# Altium footprint library ICs_rus.PCBLIB: 103 footprints (part 6 of 7)
Each footprint in its own frame and in the unit in brackets; x right, y up, seen from the top. Pads: shape width x height; smd on the part's side, far side on the other; paste and mask are expansions set on the pad; w line width, h text height; cw(c..) or ccw(c..) is an arc to the next point about the centre after c.
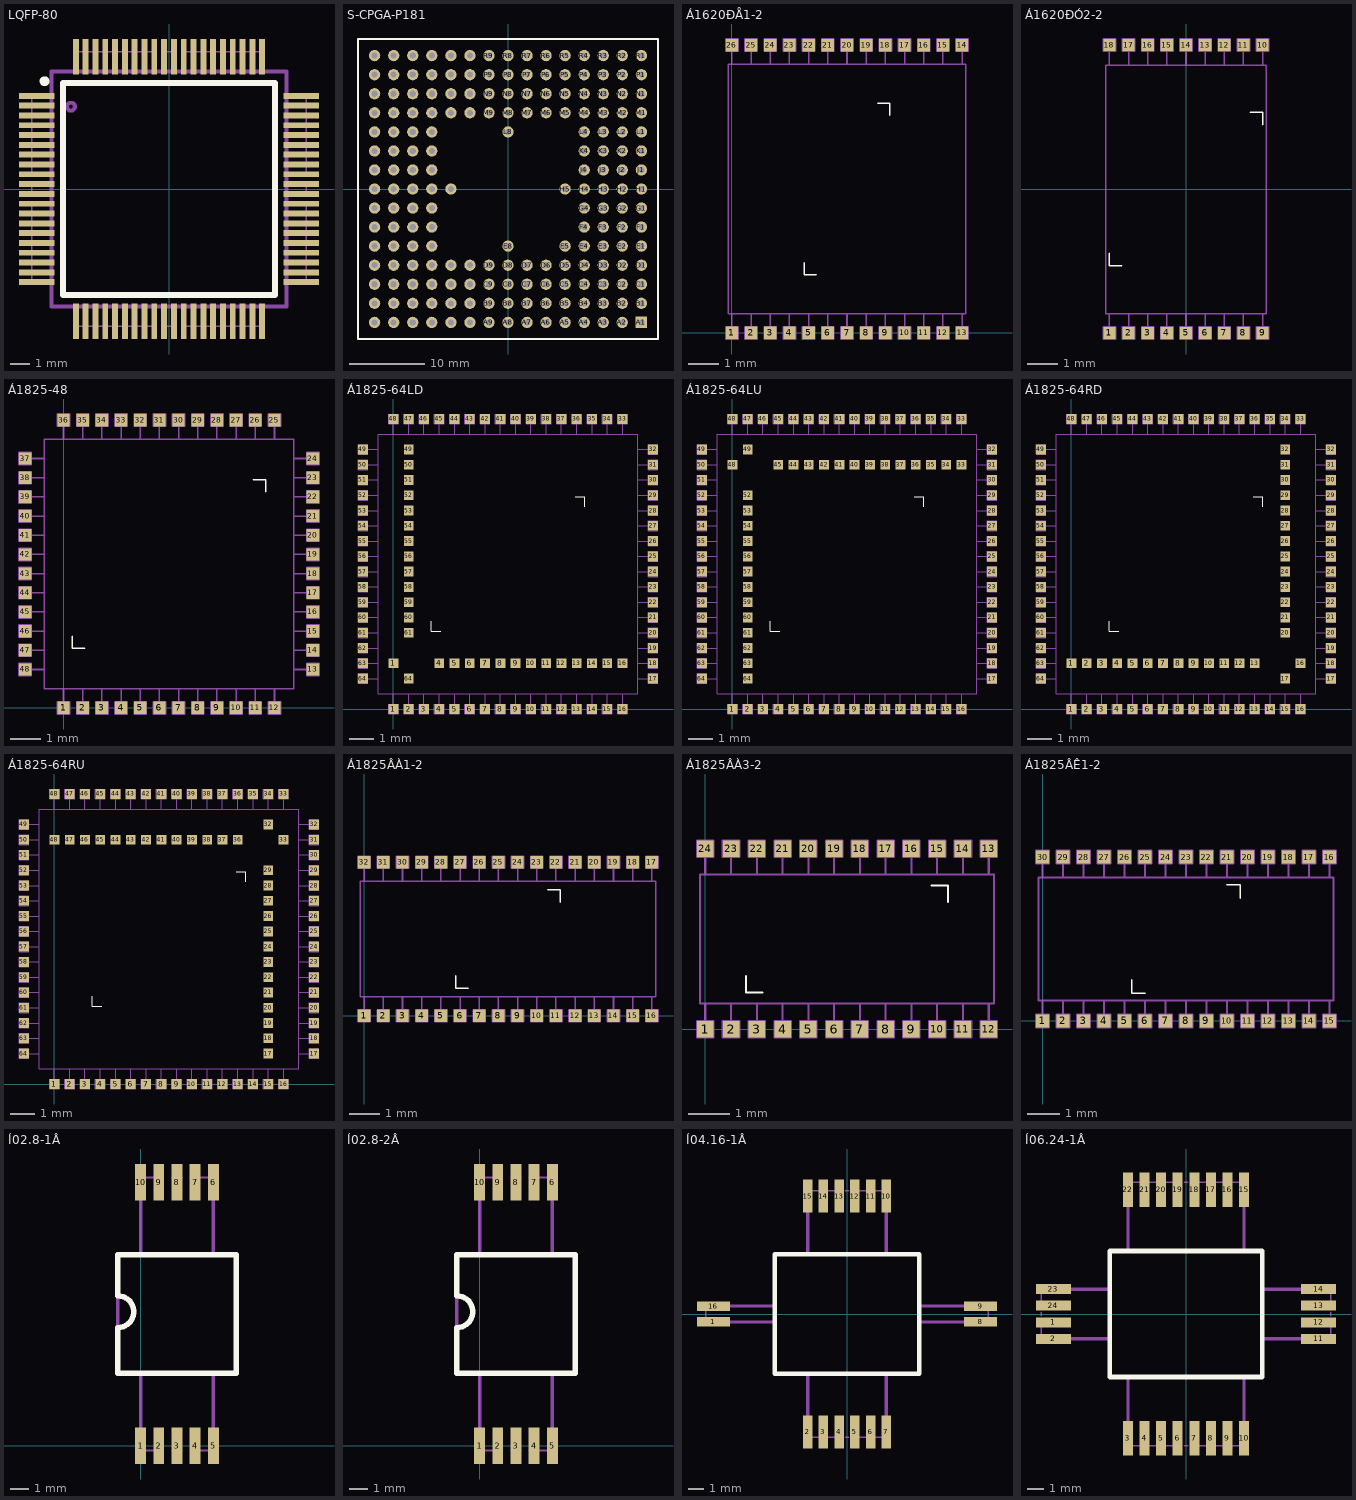
[diagram p5: the footprints below, top view; thin cyan lines are the x and y axes]

## LQFP-80 [mm]
height 1.45
pads (80):
  rect 1.8x0.3 smd: 1(-6.75,4.75) 2(-6.75,4.25) 3(-6.75,3.75) 4(-6.75,3.25) 5(-6.75,2.75) 6(-6.75,2.25) 7(-6.75,1.75) 8(-6.75,1.25) 9(-6.75,0.75) 10(-6.75,0.25) 11(-6.75,-0.25) 12(-6.75,-0.75) 13(-6.75,-1.25) 14(-6.75,-1.75) 15(-6.75,-2.25) 16(-6.75,-2.75) 17(-6.75,-3.25) 18(-6.75,-3.75) 19(-6.75,-4.25) 20(-6.75,-4.75) 41(6.75,-4.75) 42(6.75,-4.25) 43(6.75,-3.75) 44(6.75,-3.25) 45(6.75,-2.75) 46(6.75,-2.25) 47(6.75,-1.75) 48(6.75,-1.25) 49(6.75,-0.75) 50(6.75,-0.25) 51(6.75,0.25) 52(6.75,0.75) 53(6.75,1.25) 54(6.75,1.75) 55(6.75,2.25) 56(6.75,2.75) 57(6.75,3.25) 58(6.75,3.75) 59(6.75,4.25) 60(6.75,4.75)
  rect 0.3x1.8 smd: 21(-4.75,-6.75) 22(-4.25,-6.75) 23(-3.75,-6.75) 24(-3.25,-6.75) 25(-2.75,-6.75) 26(-2.25,-6.75) 27(-1.75,-6.75) 28(-1.25,-6.75) 29(-0.75,-6.75) 30(-0.25,-6.75) 31(0.25,-6.75) 32(0.75,-6.75) 33(1.25,-6.75) 34(1.75,-6.75) 35(2.25,-6.75) 36(2.75,-6.75) 37(3.25,-6.75) 38(3.75,-6.75) 39(4.25,-6.75) 40(4.75,-6.75) 61(4.75,6.75) 62(4.25,6.75) 63(3.75,6.75) 64(3.25,6.75) 65(2.75,6.75) 66(2.25,6.75) 67(1.75,6.75) 68(1.25,6.75) 69(0.75,6.75) 70(0.25,6.75) 71(-0.25,6.75) 72(-0.75,6.75) 73(-1.25,6.75) 74(-1.75,6.75) 75(-2.25,6.75) 76(-2.75,6.75) 77(-3.25,6.75) 78(-3.75,6.75) 79(-4.25,6.75) 80(-4.75,6.75)
Top Overlay:
  circle w0.3: c-6.35,5.5 r0.1
  lines w0.3: -5.4,-5.4 -5.4,5.4 5.4,5.4 5.4,-5.4 -5.4,-5.4
Mechanical 1:
  lines w0.1: -7,-4.75 -7,-4.25 -7,-0.75 ; -7,-0.25 -7,0.25 ; -7,0.75 -7,4.75 ; -4.75,-7 -0.75,-7 ; -4.75,7 -4.25,7 -0.75,7 ; -0.25,-7 0.25,-7 ; -0.25,7 0.25,7 ; 0.75,-7 4.25,-7 4.75,-7 ; 0.75,7 4.75,7 ; 7,-4.75 7,-0.75 ; 7,-0.25 7,0.25 ; 7,0.75 7,4.25 7,4.75
  lines w0.2: -7,-4.75 -6,-4.75 ; -7,4.75 -6,4.75 ; -4.75,-7 -4.75,-6 ; -4.75,6 -4.75,7 ; 4.75,-7 4.75,-6 ; 4.75,6 4.75,7 ; 6,-4.75 7,-4.75 ; 6,4.75 7,4.75 ; -6,-6 -6,6 6,6 6,-6 -6,-6 ; -4.8,4.2 ccw(c-5,4.2) -4.8,4.2
  text "80" at -4.6,4.4 h1.5
  text ".Comment" at -2.87,-1.47 h1.5
  text ".Designator" at -1.28,0.23 h1.5
3D body: height 1.47, standoff 0, extent -7,-7 7,7

## S-CPGA-P181 [mm]
pads (181):
  rect 1.5x1.5 hole 0.8: A1(17.78,-17.78)
  round 1.5 hole 0.8: A2(15.24,-17.78) A3(12.7,-17.78) A4(10.16,-17.78) A5(7.62,-17.78) A6(5.08,-17.78) A7(2.54,-17.78) A8(0,-17.78) A9(-2.54,-17.78) A10(-5.08,-17.78) A11(-7.62,-17.78) A12(-10.16,-17.78) A13(-12.7,-17.78) A14(-15.24,-17.78) A15(-17.78,-17.78) B1(17.78,-15.24) B2(15.24,-15.24) B3(12.7,-15.24) B4(10.16,-15.24) B5(7.62,-15.24) B6(5.08,-15.24) B7(2.54,-15.24) B8(0,-15.24) B9(-2.54,-15.24) B10(-5.08,-15.24) B11(-7.62,-15.24) B12(-10.16,-15.24) B13(-12.7,-15.24) B14(-15.24,-15.24) B15(-17.78,-15.24) C1(17.78,-12.7) C2(15.24,-12.7) C3(12.7,-12.7) C4(10.16,-12.7) C5(7.62,-12.7) C6(5.08,-12.7) C7(2.54,-12.7) C8(0,-12.7) C9(-2.54,-12.7) C10(-5.08,-12.7) C11(-7.62,-12.7) C12(-10.16,-12.7) C13(-12.7,-12.7) C14(-15.24,-12.7) C15(-17.78,-12.7) D1(17.78,-10.16) D2(15.24,-10.16) D3(12.7,-10.16) D4(10.16,-10.16) D5(7.62,-10.16) D6(5.08,-10.16) D7(2.54,-10.16) D8(0,-10.16) D9(-2.54,-10.16) D10(-5.08,-10.16) D11(-7.62,-10.16) D12(-10.16,-10.16) D13(-12.7,-10.16) D14(-15.24,-10.16) D15(-17.78,-10.16) E1(17.78,-7.62) E2(15.24,-7.62) E3(12.7,-7.62) E4(10.16,-7.62) E5(7.62,-7.62) E8(0,-7.62) E12(-10.16,-7.62) E13(-12.7,-7.62) E14(-15.24,-7.62) E15(-17.78,-7.62) F1(17.78,-5.08) F2(15.24,-5.08) F3(12.7,-5.08) F4(10.16,-5.08) F12(-10.16,-5.08) F13(-12.7,-5.08) F14(-15.24,-5.08) F15(-17.78,-5.08) G1(17.78,-2.54) G2(15.24,-2.54) G3(12.7,-2.54) G4(10.16,-2.54) G12(-10.16,-2.54) G13(-12.7,-2.54) G14(-15.24,-2.54) G15(-17.78,-2.54) H1(17.78,0) H2(15.24,0) H3(12.7,0) H4(10.16,0) H5(7.62,0) H11(-7.62,0) H12(-10.16,0) H13(-12.7,0) H14(-15.24,0) H15(-17.78,0) J1(17.78,2.54) J2(15.24,2.54) J3(12.7,2.54) J4(10.16,2.54) J12(-10.16,2.54) J13(-12.7,2.54) J14(-15.24,2.54) J15(-17.78,2.54) K1(17.78,5.08) K2(15.24,5.08) K3(12.7,5.08) K4(10.16,5.08) K12(-10.16,5.08) K13(-12.7,5.08) K14(-15.24,5.08) K15(-17.78,5.08) L1(17.78,7.62) L2(15.24,7.62) L3(12.7,7.62) L4(10.16,7.62) L8(0,7.62) L12(-10.16,7.62) L13(-12.7,7.62) L14(-15.24,7.62) L15(-17.78,7.62) M1(17.78,10.16) M2(15.24,10.16) M3(12.7,10.16) M4(10.16,10.16) M5(7.62,10.16) M6(5.08,10.16) M7(2.54,10.16) M8(0,10.16) M9(-2.54,10.16) M10(-5.08,10.16) M11(-7.62,10.16) M12(-10.16,10.16) M13(-12.7,10.16) M14(-15.24,10.16) M15(-17.78,10.16) N1(17.78,12.7) N2(15.24,12.7) N3(12.7,12.7) N4(10.16,12.7) N5(7.62,12.7) N6(5.08,12.7) N7(2.54,12.7) N8(0,12.7) N9(-2.54,12.7) N10(-5.08,12.7) N11(-7.62,12.7) N12(-10.16,12.7) N13(-12.7,12.7) N14(-15.24,12.7) N15(-17.78,12.7) P1(17.78,15.24) P2(15.24,15.24) P3(12.7,15.24) P4(10.16,15.24) P5(7.62,15.24) P6(5.08,15.24) P7(2.54,15.24) P8(0,15.24) P9(-2.54,15.24) P10(-5.08,15.24) P11(-7.62,15.24) P12(-10.16,15.24) P13(-12.7,15.24) P14(-15.24,15.24) P15(-17.78,15.24) R1(17.78,17.78) R2(15.24,17.78) R3(12.7,17.78) R4(10.16,17.78) R5(7.62,17.78) R6(5.08,17.78) R7(2.54,17.78) R8(0,17.78) R9(-2.54,17.78) R10(-5.08,17.78) R11(-7.62,17.78) R12(-10.16,17.78) R13(-12.7,17.78) R14(-15.24,17.78) R15(-17.78,17.78)
Top Overlay:
  lines w0.3: -20,-20 -20,20 20,20 20,-20 -20,-20
Mechanical 1:
  lines w0.2: -20,-20 -20,20 20,20 20,-20 -20,-20
  text ".Comment" at -3.9,-0.7 h1.5
  text ".Designator" at -2,1.4 h1.5
3D body: height 4.6, standoff -3, extent -20,-20 20,20

## Á1620ÐÅ1-2 [mm]
pads (26):
  rect 0.4x0.4 smd mask+0: 1(0,0) 2(0.625,0) 3(1.25,0) 4(1.875,0) 5(2.5,0) 6(3.125,0) 7(3.75,0) 8(4.375,0) 9(5,0) 10(5.625,0) 11(6.25,0) 12(6.875,0) 13(7.5,0) 14(7.5,9.375) 15(6.875,9.375) 16(6.25,9.375) 17(5.625,9.375) 18(5,9.375) 19(4.375,9.375) 20(3.75,9.375) 21(3.125,9.375) 22(2.5,9.375) 23(1.875,9.375) 24(1.25,9.375) 25(0.625,9.375) 26(0,9.375)
Top Overlay:
  lines w0.05: 2.35,2.287 2.35,1.887 2.75,1.887 ; 4.75,7.487 5.15,7.487 5.15,7.087
Mechanical 1:
  lines w0.05: 0,0.2 0,0.625 ; 0,8.75 0,9.18 ; 0.625,0.2 0.625,0.625 ; 0.625,8.75 0.625,9.17 ; 1.25,0.2 1.25,0.625 ; 1.25,8.75 1.25,9.17 ; 1.875,0.21 1.875,0.625 ; 1.875,8.75 1.875,9.17 ; 2.5,0.2 2.5,0.625 ; 2.5,8.75 2.5,9.17 ; 3.125,0.2 3.125,0.625 ; 3.125,8.75 3.125,9.17 ; 3.75,0.2 3.75,0.625 ; 3.75,8.75 3.75,9.17 ; 4.375,0.2 4.375,0.625 ; 4.375,8.75 4.375,9.17 ; 5,0.2 5,0.625 ; 5,8.75 5,9.17 ; 5.625,0.2 5.625,0.625 ; 5.625,8.75 5.625,9.17 ; 6.25,0.21 6.25,0.625 ; 6.25,8.75 6.25,9.17 ; 6.875,0.2 6.875,0.625 ; 6.875,8.75 6.875,9.17 ; 7.5,0.2 7.5,0.625 ; 7.5,8.75 7.5,9.17 ; -0.2,-0.2 -0.2,0.2 0.2,0.2 0.2,-0.2 -0.2,-0.2 ; -0.2,9.175 0.2,9.175 0.2,9.575 -0.2,9.575 -0.2,9.175 ; -0.125,0.625 -0.125,8.75 7.625,8.75 7.625,0.625 -0.125,0.625 ; 0.425,-0.2 0.425,0.2 0.825,0.2 0.825,-0.2 0.425,-0.2 ; 0.425,9.175 0.425,9.575 0.825,9.575 0.825,9.175 0.425,9.175 ; 1.05,-0.2 1.05,0.2 1.45,0.2 1.45,-0.2 1.05,-0.2 ; 1.05,9.175 1.05,9.575 1.45,9.575 1.45,9.175 1.05,9.175 ; 1.675,-0.2 1.675,0.2 2.075,0.2 2.075,-0.2 1.675,-0.2 ; 1.675,9.175 1.675,9.575 2.075,9.575 2.075,9.175 1.675,9.175 ; 2.3,-0.2 2.3,0.2 2.7,0.2 2.7,-0.2 2.3,-0.2 ; 2.3,9.175 2.3,9.575 2.7,9.575 2.7,9.175 2.3,9.175 ; 2.925,-0.2 2.925,0.2 3.325,0.2 3.325,-0.2 2.925,-0.2 ; 2.925,9.175 2.925,9.575 3.325,9.575 3.325,9.175 2.925,9.175 ; 3.55,-0.2 3.55,0.2 3.95,0.2 3.95,-0.2 3.55,-0.2 ; 3.55,9.175 3.55,9.575 3.95,9.575 3.95,9.175 3.55,9.175 ; 4.175,-0.2 4.175,0.2 4.575,0.2 4.575,-0.2 4.175,-0.2 ; 4.175,9.175 4.175,9.575 4.575,9.575 4.575,9.175 4.175,9.175 ; 4.8,-0.2 4.8,0.2 5.2,0.2 5.2,-0.2 4.8,-0.2 ; 4.8,9.175 4.8,9.575 5.2,9.575 5.2,9.175 4.8,9.175 ; 5.425,-0.2 5.425,0.2 5.825,0.2 5.825,-0.2 5.425,-0.2 ; 5.425,9.175 5.425,9.575 5.825,9.575 5.825,9.175 5.425,9.175 ; 6.05,-0.2 6.05,0.2 6.45,0.2 6.45,-0.2 6.05,-0.2 ; 6.05,9.175 6.05,9.575 6.45,9.575 6.45,9.175 6.05,9.175 ; 6.675,-0.2 6.675,0.2 7.075,0.2 7.075,-0.2 6.675,-0.2 ; 6.675,9.175 6.675,9.575 7.075,9.575 7.075,9.175 6.675,9.175 ; 7.3,-0.2 7.3,0.2 7.7,0.2 7.7,-0.2 7.3,-0.2 ; 7.3,9.175 7.3,9.575 7.7,9.575 7.7,9.175 7.3,9.175
  text "9" at 4.95,-0.1 h0.35
  text "8" at 4.325,-0.1 h0.35
  text "7" at 3.7,-0.1 h0.35
  text "6" at 3.075,-0.1 h0.35
  text "5" at 2.45,-0.1 h0.35
  text "4" at 1.825,-0.1 h0.35
  text "3" at 1.2,-0.1 h0.35
  text "2" at 0.575,-0.1 h0.35
  text "1" at -0.05,-0.1 h0.35
  text "10" at 5.475,-0.1 h0.35
  text "11" at 6.1,-0.1 h0.35
  text "12" at 6.725,-0.1 h0.35
  text "13" at 7.35,-0.1 h0.35
  text ".Comment" at 2.8,3.9 h0.4
  text ".Designator" at 3.15,4.7 h0.6
  text "24" at 1.1,9.275 h0.35
  text "23" at 1.725,9.275 h0.35
  text "22" at 2.35,9.275 h0.35
  text "21" at 2.975,9.275 h0.35
  text "20" at 3.6,9.275 h0.35
  text "19" at 4.225,9.275 h0.35
  text "18" at 4.85,9.275 h0.35
  text "17" at 5.475,9.275 h0.35
  text "16" at 6.125,9.275 h0.35
  text "15" at 6.75,9.275 h0.35
  text "14" at 7.375,9.275 h0.35
  text "25" at 0.475,9.275 h0.35
  text "26" at -0.15,9.275 h0.35

## Á1620ÐÓ2-2 [mm]
pads (18):
  rect 0.4x0.4 smd mask+0: 1(-2.5,-4.7) 2(-1.875,-4.7) 3(-1.25,-4.7) 4(-0.625,-4.7) 5(0,-4.7) 6(0.625,-4.7) 7(1.25,-4.7) 8(1.875,-4.7) 9(2.5,-4.7) 10(2.5,4.7) 11(1.875,4.7) 12(1.25,4.7) 13(0.625,4.7) 14(0,4.7) 15(-0.625,4.7) 16(-1.25,4.7) 17(-1.875,4.7) 18(-2.5,4.7)
Top Overlay:
  lines w0.05: -2.5,-2.1 -2.5,-2.5 -2.1,-2.5 ; 2.1,2.5 2.5,2.5 2.5,2.1
Mechanical 1:
  lines w0.05: -2.5,-4.5 -2.5,-4.075 ; -2.5,4.05 -2.5,4.48 ; -1.875,-4.5 -1.875,-4.075 ; -1.875,4.05 -1.875,4.47 ; -1.25,-4.5 -1.25,-4.075 ; -1.25,4.05 -1.25,4.47 ; -0.625,-4.49 -0.625,-4.075 ; -0.625,4.05 -0.625,4.47 ; 0,-4.5 0,-4.075 ; 0,4.05 0,4.47 ; 0.625,-4.5 0.625,-4.075 ; 0.625,4.05 0.625,4.47 ; 1.25,-4.5 1.25,-4.075 ; 1.25,4.05 1.25,4.47 ; 1.875,-4.5 1.875,-4.075 ; 1.875,4.05 1.875,4.47 ; 2.5,-4.5 2.5,-4.075 ; 2.5,4.05 2.5,4.47 ; -2.7,-4.9 -2.7,-4.5 -2.3,-4.5 -2.3,-4.9 -2.7,-4.9 ; -2.7,4.5 -2.7,4.9 -2.3,4.9 -2.3,4.5 -2.7,4.5 ; -2.625,-4.075 -2.625,4.05 2.625,4.05 2.625,-4.075 -2.625,-4.075 ; -2.075,-4.9 -2.075,-4.5 -1.675,-4.5 -1.675,-4.9 -2.075,-4.9 ; -2.075,4.5 -2.075,4.9 -1.675,4.9 -1.675,4.5 -2.075,4.5 ; -1.45,-4.9 -1.45,-4.5 -1.05,-4.5 -1.05,-4.9 -1.45,-4.9 ; -1.45,4.5 -1.45,4.9 -1.05,4.9 -1.05,4.5 -1.45,4.5 ; -0.825,-4.9 -0.825,-4.5 -0.425,-4.5 -0.425,-4.9 -0.825,-4.9 ; -0.825,4.5 -0.825,4.9 -0.425,4.9 -0.425,4.5 -0.825,4.5 ; -0.2,-4.9 -0.2,-4.5 0.2,-4.5 0.2,-4.9 -0.2,-4.9 ; -0.2,4.5 -0.2,4.9 0.2,4.9 0.2,4.5 -0.2,4.5 ; 0.425,-4.9 0.425,-4.5 0.825,-4.5 0.825,-4.9 0.425,-4.9 ; 0.425,4.5 0.825,4.5 0.825,4.9 0.425,4.9 0.425,4.5 ; 1.05,-4.9 1.05,-4.5 1.45,-4.5 1.45,-4.9 1.05,-4.9 ; 1.05,4.5 1.45,4.5 1.45,4.9 1.05,4.9 1.05,4.5 ; 1.675,-4.9 1.675,-4.5 2.075,-4.5 2.075,-4.9 1.675,-4.9 ; 1.675,4.5 2.075,4.5 2.075,4.9 1.675,4.9 1.675,4.5 ; 2.3,-4.9 2.3,-4.5 2.7,-4.5 2.7,-4.9 2.3,-4.9 ; 2.3,4.5 2.7,4.5 2.7,4.9 2.3,4.9 2.3,4.5
  text "9" at 2.45,-4.8 h0.35
  text "8" at 1.825,-4.8 h0.35
  text "7" at 1.2,-4.8 h0.35
  text "6" at 0.575,-4.8 h0.35
  text "5" at -0.05,-4.8 h0.35
  text "4" at -0.675,-4.8 h0.35
  text "3" at -1.3,-4.8 h0.35
  text "2" at -1.925,-4.8 h0.35
  text "1" at -2.55,-4.8 h0.35
  text "10" at 2.35,4.6 h0.35
  text "11" at 1.725,4.6 h0.35
  text "12" at 1.1,4.6 h0.35
  text "13" at 0.475,4.6 h0.35
  text ".Comment" at -1.05,-0.8 h0.4
  text ".Designator" at -0.75,0 h0.6
  text "18" at -2.65,4.6 h0.35
  text "17" at -2.025,4.6 h0.35
  text "16" at -1.375,4.6 h0.35
  text "15" at -0.75,4.6 h0.35
  text "14" at -0.125,4.6 h0.35

## Á1825-48 [mm]
pads (48):
  rect 0.4x0.4 smd mask+0: 1(0,0) 2(0.625,0) 3(1.25,0) 4(1.875,0) 5(2.5,0) 6(3.125,0) 7(3.75,0) 8(4.375,0) 9(5,0) 10(5.625,0) 11(6.25,0) 12(6.875,0) 13(8.125,1.25) 14(8.125,1.875) 15(8.125,2.5) 16(8.125,3.125) 17(8.125,3.75) 18(8.125,4.375) 19(8.125,5) 20(8.125,5.625) 21(8.125,6.25) 22(8.125,6.875) 23(8.125,7.5) 24(8.125,8.125) 25(6.875,9.375) 26(6.25,9.375) 27(5.625,9.375) 28(5,9.375) 29(4.375,9.375) 30(3.75,9.375) 31(3.125,9.375) 32(2.5,9.375) 33(1.875,9.375) 34(1.25,9.375) 35(0.625,9.375) 36(0,9.375) 37(-1.25,8.125) 38(-1.25,7.5) 39(-1.25,6.875) 40(-1.25,6.25) 41(-1.25,5.625) 42(-1.25,5) 43(-1.25,4.375) 44(-1.25,3.75) 45(-1.25,3.125) 46(-1.25,2.5) 47(-1.25,1.875) 48(-1.25,1.25)
Top Overlay:
  lines w0.05: 0.288,2.337 0.288,1.937 0.687,1.937 ; 6.187,7.437 6.587,7.437 6.587,7.037
Mechanical 1:
  drawing of 244 lines, arcs and shapes, not listed
  text "48" at -1.4,1.15 h0.35
  text "47" at -1.4,1.775 h0.35
  text "46" at -1.4,2.4 h0.35
  text "45" at -1.4,3.025 h0.35
  text "44" at -1.4,3.65 h0.35
  text "43" at -1.4,4.275 h0.35
  text "42" at -1.4,4.9 h0.35
  text "41" at -1.4,5.525 h0.35
  text "40" at -1.4,6.15 h0.35
  text "39" at -1.4,6.775 h0.35
  text "38" at -1.4,7.4 h0.35
  text "35" at 0.475,9.275 h0.35
  text "37" at -1.4,8.025 h0.35
  text "36" at -0.15,9.275 h0.35
  text "34" at 1.1,9.275 h0.35
  text "33" at 1.725,9.275 h0.35
  text "32" at 2.37,9.27 h0.35
  text "31" at 2.995,9.27 h0.35
  text "30" at 3.62,9.27 h0.35
  text "29" at 4.245,9.27 h0.35
  text "28" at 4.87,9.27 h0.35
  text "27" at 5.495,9.27 h0.35
  text "26" at 6.12,9.27 h0.35
  text "25" at 6.745,9.27 h0.35
  text "24" at 7.975,8.025 h0.35
  text "23" at 7.975,7.4 h0.35
  text "22" at 7.975,6.775 h0.35
  text "21" at 7.975,6.15 h0.35
  text "20" at 7.975,5.525 h0.35
  text "19" at 7.975,4.9 h0.35
  text "18" at 7.975,4.275 h0.35
  text "17" at 7.975,3.65 h0.35
  text "13" at 8,1.125 h0.35
  text "14" at 8,1.75 h0.35
  text "15" at 8,2.375 h0.35
  text "16" at 8,3 h0.35
  text ".Designator" at 2.9,4.825 h0.6
  text ".Comment" at 2.55,4.025 h0.4
  text "9" at 4.95,-0.1 h0.35
  text "8" at 4.325,-0.1 h0.35
  text "7" at 3.7,-0.1 h0.35
  text "6" at 3.075,-0.1 h0.35
  text "5" at 2.45,-0.1 h0.35
  text "4" at 1.825,-0.1 h0.35
  text "3" at 1.2,-0.1 h0.35
  text "2" at 0.575,-0.1 h0.35
  text "1" at -0.05,-0.1 h0.35
  text "10" at 5.475,-0.1 h0.35
  text "11" at 6.1,-0.1 h0.35
  text "12" at 6.725,-0.1 h0.35

## Á1825-64LD [mm]
pads (92):
  rect 0.4x0.4 smd mask+0: 1(0,0) 1(0,1.875) 2(0.625,0) 3(1.25,0) 4(1.875,0) 4(1.875,1.875) 5(2.5,0) 5(2.5,1.875) 6(3.125,0) 6(3.125,1.875) 7(3.75,0) 7(3.75,1.875) 8(4.375,0) 8(4.375,1.875) 9(5,0) 9(5,1.875) 10(5.625,0) 10(5.625,1.875) 11(6.25,0) 11(6.25,1.875) 12(6.875,0) 12(6.875,1.875) 13(7.5,0) 13(7.5,1.875) 14(8.125,0) 14(8.125,1.875) 15(8.75,0) 15(8.75,1.875) 16(9.375,0) 16(9.375,1.875) 17(10.625,1.25) 18(10.625,1.875) 19(10.625,2.5) 20(10.625,3.125) 21(10.625,3.75) 22(10.625,4.375) 23(10.625,5) 24(10.625,5.625) 25(10.625,6.25) 26(10.625,6.875) 27(10.625,7.5) 28(10.625,8.125) 29(10.625,8.75) 30(10.625,9.375) 31(10.625,10) 32(10.625,10.625) 33(9.375,11.875) 34(8.75,11.875) 35(8.125,11.875) 36(7.5,11.875) 37(6.875,11.875) 38(6.25,11.875) 39(5.625,11.875) 40(5,11.875) 41(4.375,11.875) 42(3.75,11.875) 43(3.125,11.875) 44(2.5,11.875) 45(1.875,11.875) 46(1.25,11.875) 47(0.625,11.875) 48(0,11.875) 49(-1.25,10.625) 49(0.625,10.625) 50(-1.25,10) 50(0.625,10) 51(-1.25,9.375) 51(0.625,9.375) 52(-1.25,8.75) 52(0.625,8.75) 53(-1.25,8.125) 53(0.625,8.125) 54(-1.25,7.5) 54(0.625,7.5) 55(-1.25,6.875) 55(0.625,6.875) 56(-1.25,6.25) 56(0.625,6.25) 57(-1.25,5.625) 57(0.625,5.625) 58(-1.25,5) 58(0.625,5) 59(-1.25,4.375) 59(0.625,4.375) 60(-1.25,3.75) 60(0.625,3.75) 61(-1.25,3.125) 61(0.625,3.125) 62(-1.25,2.5) 63(-1.25,1.875) 64(-1.25,1.25) 64(0.625,1.25)
Top Overlay:
  lines w0.05: 1.538,3.587 1.538,3.187 1.937,3.187 ; 7.437,8.687 7.837,8.687 7.837,8.287
Mechanical 1:
  drawing of 324 lines, arcs and shapes, not listed
  text "12" at 6.725,-0.1 h0.35
  text "11" at 6.1,-0.1 h0.35
  text "10" at 5.475,-0.1 h0.35
  text "1" at -0.05,-0.1 h0.35
  text "2" at 0.575,-0.1 h0.35
  text "3" at 1.2,-0.1 h0.35
  text "4" at 1.825,-0.1 h0.35
  text "5" at 2.45,-0.1 h0.35
  text "6" at 3.075,-0.1 h0.35
  text "7" at 3.7,-0.1 h0.35
  text "8" at 4.325,-0.1 h0.35
  text "9" at 4.95,-0.1 h0.35
  text ".Comment" at 3.55,5.275 h0.4
  text ".Designator" at 3.9,6.075 h0.6
  text "16" at 9.225,-0.1 h0.35
  text "15" at 8.6,-0.1 h0.35
  text "14" at 7.975,-0.1 h0.35
  text "13" at 7.35,-0.1 h0.35
  text "17" at 10.475,1.15 h0.35
  text "18" at 10.475,1.775 h0.35
  text "19" at 10.475,2.4 h0.35
  text "20" at 10.475,3.025 h0.35
  text "21" at 10.475,3.65 h0.35
  text "22" at 10.475,4.275 h0.35
  text "23" at 10.475,4.9 h0.35
  text "24" at 10.475,5.525 h0.35
  text "25" at 10.475,6.15 h0.35
  text "26" at 10.475,6.775 h0.35
  text "27" at 10.475,7.4 h0.35
  text "28" at 10.475,8.025 h0.35
  text "29" at 10.475,8.65 h0.35
  text "30" at 10.475,9.275 h0.35
  text "31" at 10.475,9.9 h0.35
  text "32" at 10.475,10.525 h0.35
  text "33" at 9.225,11.775 h0.35
  text "34" at 8.6,11.775 h0.35
  text "36" at 7.35,11.775 h0.35
  text "37" at 6.725,11.775 h0.35
  text "35" at 7.975,11.775 h0.35
  text "38" at 6.1,11.775 h0.35
  text "39" at 5.475,11.775 h0.35
  text "40" at 4.85,11.775 h0.35
  text "41" at 4.225,11.775 h0.35
  text "42" at 3.6,11.775 h0.35
  text "43" at 2.975,11.775 h0.35
  text "44" at 2.35,11.775 h0.35
  text "45" at 1.725,11.775 h0.35
  text "46" at 1.1,11.775 h0.35
  text "47" at 0.475,11.775 h0.35
  text "48" at -0.15,11.775 h0.35
  text "49" at -1.4,10.525 h0.35
  text "50" at -1.4,9.9 h0.35
  text "51" at -1.4,9.275 h0.35
  text "52" at -1.4,8.65 h0.35
  text "53" at -1.4,8.025 h0.35
  text "54" at -1.4,7.4 h0.35
  text "55" at -1.4,6.775 h0.35
  text "56" at -1.4,6.15 h0.35
  text "57" at -1.4,5.525 h0.35
  text "58" at -1.4,4.9 h0.35
  text "59" at -1.4,4.275 h0.35
  text "60" at -1.4,3.65 h0.35
  text "61" at -1.4,3.025 h0.35
  text "62" at -1.4,2.4 h0.35
  text "63" at -1.4,1.775 h0.35
  text "64" at -1.4,1.15 h0.35

## Á1825-64LU [mm]
pads (92):
  rect 0.4x0.4 smd mask+0: 1(0,0) 2(0.625,0) 3(1.25,0) 4(1.875,0) 5(2.5,0) 6(3.125,0) 7(3.75,0) 8(4.375,0) 9(5,0) 10(5.625,0) 11(6.25,0) 12(6.875,0) 13(7.5,0) 14(8.125,0) 15(8.75,0) 16(9.375,0) 17(10.625,1.25) 18(10.625,1.875) 19(10.625,2.5) 20(10.625,3.125) 21(10.625,3.75) 22(10.625,4.375) 23(10.625,5) 24(10.625,5.625) 25(10.625,6.25) 26(10.625,6.875) 27(10.625,7.5) 28(10.625,8.125) 29(10.625,8.75) 30(10.625,9.375) 31(10.625,10) 32(10.625,10.625) 33(9.375,10) 33(9.375,11.875) 34(8.75,10) 34(8.75,11.875) 35(8.125,10) 35(8.125,11.875) 36(7.5,10) 36(7.5,11.875) 37(6.875,10) 37(6.875,11.875) 38(6.25,10) 38(6.25,11.875) 39(5.625,10) 39(5.625,11.875) 40(5,10) 40(5,11.875) 41(4.375,10) 41(4.375,11.875) 42(3.75,10) 42(3.75,11.875) 43(3.125,10) 43(3.125,11.875) 44(2.5,10) 44(2.5,11.875) 45(1.875,10) 45(1.875,11.875) 46(1.25,11.875) 47(0.625,11.875) 48(0,10) 48(0,11.875) 49(-1.25,10.625) 49(0.625,10.625) 50(-1.25,10) 51(-1.25,9.375) 52(-1.25,8.75) 52(0.625,8.75) 53(-1.25,8.125) 53(0.625,8.125) 54(-1.25,7.5) 54(0.625,7.5) 55(-1.25,6.875) 55(0.625,6.875) 56(-1.25,6.25) 56(0.625,6.25) 57(-1.25,5.625) 57(0.625,5.625) 58(-1.25,5) 58(0.625,5) 59(-1.25,4.375) 59(0.625,4.375) 60(-1.25,3.75) 60(0.625,3.75) 61(-1.25,3.125) 61(0.625,3.125) 62(-1.25,2.5) 62(0.625,2.5) 63(-1.25,1.875) 63(0.625,1.875) 64(-1.25,1.25) 64(0.625,1.25)
Top Overlay:
  lines w0.05: 1.538,3.587 1.538,3.187 1.937,3.187 ; 7.437,8.687 7.837,8.687 7.837,8.287
Mechanical 1:
  drawing of 324 lines, arcs and shapes, not listed
  text "12" at 6.725,-0.1 h0.35
  text "11" at 6.1,-0.1 h0.35
  text "10" at 5.475,-0.1 h0.35
  text "1" at -0.05,-0.1 h0.35
  text "2" at 0.575,-0.1 h0.35
  text "3" at 1.2,-0.1 h0.35
  text "4" at 1.825,-0.1 h0.35
  text "5" at 2.45,-0.1 h0.35
  text "6" at 3.075,-0.1 h0.35
  text "7" at 3.7,-0.1 h0.35
  text "8" at 4.325,-0.1 h0.35
  text "9" at 4.95,-0.1 h0.35
  text ".Comment" at 3.55,5.275 h0.4
  text ".Designator" at 3.9,6.075 h0.6
  text "16" at 9.225,-0.1 h0.35
  text "15" at 8.6,-0.1 h0.35
  text "14" at 7.975,-0.1 h0.35
  text "13" at 7.35,-0.1 h0.35
  text "17" at 10.475,1.15 h0.35
  text "18" at 10.475,1.775 h0.35
  text "19" at 10.475,2.4 h0.35
  text "20" at 10.475,3.025 h0.35
  text "21" at 10.475,3.65 h0.35
  text "22" at 10.475,4.275 h0.35
  text "23" at 10.475,4.9 h0.35
  text "24" at 10.475,5.525 h0.35
  text "25" at 10.475,6.15 h0.35
  text "26" at 10.475,6.775 h0.35
  text "27" at 10.475,7.4 h0.35
  text "28" at 10.475,8.025 h0.35
  text "29" at 10.475,8.65 h0.35
  text "30" at 10.475,9.275 h0.35
  text "31" at 10.475,9.9 h0.35
  text "32" at 10.475,10.525 h0.35
  text "33" at 9.225,11.775 h0.35
  text "34" at 8.6,11.775 h0.35
  text "36" at 7.35,11.775 h0.35
  text "37" at 6.725,11.775 h0.35
  text "35" at 7.975,11.775 h0.35
  text "38" at 6.1,11.775 h0.35
  text "39" at 5.475,11.775 h0.35
  text "40" at 4.85,11.775 h0.35
  text "41" at 4.225,11.775 h0.35
  text "42" at 3.6,11.775 h0.35
  text "43" at 2.975,11.775 h0.35
  text "44" at 2.35,11.775 h0.35
  text "45" at 1.725,11.775 h0.35
  text "46" at 1.1,11.775 h0.35
  text "47" at 0.475,11.775 h0.35
  text "48" at -0.15,11.775 h0.35
  text "49" at -1.4,10.525 h0.35
  text "50" at -1.4,9.9 h0.35
  text "51" at -1.4,9.275 h0.35
  text "52" at -1.4,8.65 h0.35
  text "53" at -1.4,8.025 h0.35
  text "54" at -1.4,7.4 h0.35
  text "55" at -1.4,6.775 h0.35
  text "56" at -1.4,6.15 h0.35
  text "57" at -1.4,5.525 h0.35
  text "58" at -1.4,4.9 h0.35
  text "59" at -1.4,4.275 h0.35
  text "60" at -1.4,3.65 h0.35
  text "61" at -1.4,3.025 h0.35
  text "62" at -1.4,2.4 h0.35
  text "63" at -1.4,1.775 h0.35
  text "64" at -1.4,1.15 h0.35

## Á1825-64RD [mm]
pads (92):
  rect 0.4x0.4 smd mask+0: 1(0,0) 1(0,1.875) 2(0.625,0) 2(0.625,1.875) 3(1.25,0) 3(1.25,1.875) 4(1.875,0) 4(1.875,1.875) 5(2.5,0) 5(2.5,1.875) 6(3.125,0) 6(3.125,1.875) 7(3.75,0) 7(3.75,1.875) 8(4.375,0) 8(4.375,1.875) 9(5,0) 9(5,1.875) 10(5.625,0) 10(5.625,1.875) 11(6.25,0) 11(6.25,1.875) 12(6.875,0) 12(6.875,1.875) 13(7.5,0) 13(7.5,1.875) 14(8.125,0) 15(8.75,0) 16(9.375,0) 16(9.375,1.875) 17(8.75,1.25) 17(10.625,1.25) 18(10.625,1.875) 19(10.625,2.5) 20(8.75,3.125) 20(10.625,3.125) 21(8.75,3.75) 21(10.625,3.75) 22(8.75,4.375) 22(10.625,4.375) 23(8.75,5) 23(10.625,5) 24(8.75,5.625) 24(10.625,5.625) 25(8.75,6.25) 25(10.625,6.25) 26(8.75,6.875) 26(10.625,6.875) 27(8.75,7.5) 27(10.625,7.5) 28(8.75,8.125) 28(10.625,8.125) 29(8.75,8.75) 29(10.625,8.75) 30(8.75,9.375) 30(10.625,9.375) 31(8.75,10) 31(10.625,10) 32(8.75,10.625) 32(10.625,10.625) 33(9.375,11.875) 34(8.75,11.875) 35(8.125,11.875) 36(7.5,11.875) 37(6.875,11.875) 38(6.25,11.875) 39(5.625,11.875) 40(5,11.875) 41(4.375,11.875) 42(3.75,11.875) 43(3.125,11.875) 44(2.5,11.875) 45(1.875,11.875) 46(1.25,11.875) 47(0.625,11.875) 48(0,11.875) 49(-1.25,10.625) 50(-1.25,10) 51(-1.25,9.375) 52(-1.25,8.75) 53(-1.25,8.125) 54(-1.25,7.5) 55(-1.25,6.875) 56(-1.25,6.25) 57(-1.25,5.625) 58(-1.25,5) 59(-1.25,4.375) 60(-1.25,3.75) 61(-1.25,3.125) 62(-1.25,2.5) 63(-1.25,1.875) 64(-1.25,1.25)
Top Overlay:
  lines w0.05: 1.538,3.587 1.538,3.187 1.937,3.187 ; 7.437,8.687 7.837,8.687 7.837,8.287
Mechanical 1:
  drawing of 324 lines, arcs and shapes, not listed
  text "64" at -1.4,1.15 h0.35
  text "63" at -1.4,1.775 h0.35
  text "62" at -1.4,2.4 h0.35
  text "61" at -1.4,3.025 h0.35
  text "60" at -1.4,3.65 h0.35
  text "59" at -1.4,4.275 h0.35
  text "58" at -1.4,4.9 h0.35
  text "57" at -1.4,5.525 h0.35
  text "56" at -1.4,6.15 h0.35
  text "55" at -1.4,6.775 h0.35
  text "54" at -1.4,7.4 h0.35
  text "53" at -1.4,8.025 h0.35
  text "52" at -1.4,8.65 h0.35
  text "51" at -1.4,9.275 h0.35
  text "50" at -1.4,9.9 h0.35
  text "49" at -1.4,10.525 h0.35
  text "48" at -0.15,11.775 h0.35
  text "47" at 0.475,11.775 h0.35
  text "46" at 1.1,11.775 h0.35
  text "45" at 1.725,11.775 h0.35
  text "44" at 2.35,11.775 h0.35
  text "43" at 2.975,11.775 h0.35
  text "42" at 3.6,11.775 h0.35
  text "41" at 4.225,11.775 h0.35
  text "40" at 4.85,11.775 h0.35
  text "39" at 5.475,11.775 h0.35
  text "38" at 6.1,11.775 h0.35
  text "35" at 7.975,11.775 h0.35
  text "37" at 6.725,11.775 h0.35
  text "36" at 7.35,11.775 h0.35
  text "34" at 8.6,11.775 h0.35
  text "33" at 9.225,11.775 h0.35
  text "32" at 10.475,10.525 h0.35
  text "31" at 10.475,9.9 h0.35
  text "30" at 10.475,9.275 h0.35
  text "29" at 10.475,8.65 h0.35
  text "28" at 10.475,8.025 h0.35
  text "27" at 10.475,7.4 h0.35
  text "26" at 10.475,6.775 h0.35
  text "25" at 10.475,6.15 h0.35
  text "24" at 10.475,5.525 h0.35
  text "23" at 10.475,4.9 h0.35
  text "22" at 10.475,4.275 h0.35
  text "21" at 10.475,3.65 h0.35
  text "20" at 10.475,3.025 h0.35
  text "19" at 10.475,2.4 h0.35
  text "18" at 10.475,1.775 h0.35
  text "17" at 10.475,1.15 h0.35
  text "13" at 7.35,-0.1 h0.35
  text "14" at 7.975,-0.1 h0.35
  text "15" at 8.6,-0.1 h0.35
  text "16" at 9.225,-0.1 h0.35
  text ".Designator" at 3.9,6.075 h0.6
  text ".Comment" at 3.55,5.275 h0.4
  text "9" at 4.95,-0.1 h0.35
  text "8" at 4.325,-0.1 h0.35
  text "7" at 3.7,-0.1 h0.35
  text "6" at 3.075,-0.1 h0.35
  text "5" at 2.45,-0.1 h0.35
  text "4" at 1.825,-0.1 h0.35
  text "3" at 1.2,-0.1 h0.35
  text "2" at 0.575,-0.1 h0.35
  text "1" at -0.05,-0.1 h0.35
  text "10" at 5.475,-0.1 h0.35
  text "11" at 6.1,-0.1 h0.35
  text "12" at 6.725,-0.1 h0.35

## Á1825-64RU [mm]
pads (92):
  rect 0.4x0.4 smd mask+0: 1(0,0) 2(0.625,0) 3(1.25,0) 4(1.875,0) 5(2.5,0) 6(3.125,0) 7(3.75,0) 8(4.375,0) 9(5,0) 10(5.625,0) 11(6.25,0) 12(6.875,0) 13(7.5,0) 14(8.125,0) 15(8.75,0) 16(9.375,0) 17(8.75,1.25) 17(10.625,1.25) 18(8.75,1.875) 18(10.625,1.875) 19(8.75,2.5) 19(10.625,2.5) 20(8.75,3.125) 20(10.625,3.125) 21(8.75,3.75) 21(10.625,3.75) 22(8.75,4.375) 22(10.625,4.375) 23(8.75,5) 23(10.625,5) 24(8.75,5.625) 24(10.625,5.625) 25(8.75,6.25) 25(10.625,6.25) 26(8.75,6.875) 26(10.625,6.875) 27(8.75,7.5) 27(10.625,7.5) 28(8.75,8.125) 28(10.625,8.125) 29(8.75,8.75) 29(10.625,8.75) 30(10.625,9.375) 31(10.625,10) 32(8.75,10.625) 32(10.625,10.625) 33(9.375,10) 33(9.375,11.875) 34(8.75,11.875) 35(8.125,11.875) 36(7.5,10) 36(7.5,11.875) 37(6.875,10) 37(6.875,11.875) 38(6.25,10) 38(6.25,11.875) 39(5.625,10) 39(5.625,11.875) 40(5,10) 40(5,11.875) 41(4.375,10) 41(4.375,11.875) 42(3.75,10) 42(3.75,11.875) 43(3.125,10) 43(3.125,11.875) 44(2.5,10) 44(2.5,11.875) 45(1.875,10) 45(1.875,11.875) 46(1.25,10) 46(1.25,11.875) 47(0.625,10) 47(0.625,11.875) 48(0,10) 48(0,11.875) 49(-1.25,10.625) 50(-1.25,10) 51(-1.25,9.375) 52(-1.25,8.75) 53(-1.25,8.125) 54(-1.25,7.5) 55(-1.25,6.875) 56(-1.25,6.25) 57(-1.25,5.625) 58(-1.25,5) 59(-1.25,4.375) 60(-1.25,3.75) 61(-1.25,3.125) 62(-1.25,2.5) 63(-1.25,1.875) 64(-1.25,1.25)
Top Overlay:
  lines w0.05: 1.538,3.587 1.538,3.187 1.937,3.187 ; 7.437,8.687 7.837,8.687 7.837,8.287
Mechanical 1:
  drawing of 324 lines, arcs and shapes, not listed
  text "12" at 6.725,-0.1 h0.35
  text "11" at 6.1,-0.1 h0.35
  text "10" at 5.475,-0.1 h0.35
  text "1" at -0.05,-0.1 h0.35
  text "2" at 0.575,-0.1 h0.35
  text "3" at 1.2,-0.1 h0.35
  text "4" at 1.825,-0.1 h0.35
  text "5" at 2.45,-0.1 h0.35
  text "6" at 3.075,-0.1 h0.35
  text "7" at 3.7,-0.1 h0.35
  text "8" at 4.325,-0.1 h0.35
  text "9" at 4.95,-0.1 h0.35
  text ".Comment" at 3.55,5.275 h0.4
  text ".Designator" at 3.9,6.075 h0.6
  text "16" at 9.225,-0.1 h0.35
  text "15" at 8.6,-0.1 h0.35
  text "14" at 7.975,-0.1 h0.35
  text "13" at 7.35,-0.1 h0.35
  text "17" at 10.475,1.15 h0.35
  text "18" at 10.475,1.775 h0.35
  text "19" at 10.475,2.4 h0.35
  text "20" at 10.475,3.025 h0.35
  text "21" at 10.475,3.65 h0.35
  text "22" at 10.475,4.275 h0.35
  text "23" at 10.475,4.9 h0.35
  text "24" at 10.475,5.525 h0.35
  text "25" at 10.475,6.15 h0.35
  text "26" at 10.475,6.775 h0.35
  text "27" at 10.475,7.4 h0.35
  text "28" at 10.475,8.025 h0.35
  text "29" at 10.475,8.65 h0.35
  text "30" at 10.475,9.275 h0.35
  text "31" at 10.475,9.9 h0.35
  text "32" at 10.475,10.525 h0.35
  text "33" at 9.225,11.775 h0.35
  text "34" at 8.6,11.775 h0.35
  text "36" at 7.35,11.775 h0.35
  text "37" at 6.725,11.775 h0.35
  text "35" at 7.975,11.775 h0.35
  text "38" at 6.1,11.775 h0.35
  text "39" at 5.475,11.775 h0.35
  text "40" at 4.85,11.775 h0.35
  text "41" at 4.225,11.775 h0.35
  text "42" at 3.6,11.775 h0.35
  text "43" at 2.975,11.775 h0.35
  text "44" at 2.35,11.775 h0.35
  text "45" at 1.725,11.775 h0.35
  text "46" at 1.1,11.775 h0.35
  text "47" at 0.475,11.775 h0.35
  text "48" at -0.15,11.775 h0.35
  text "49" at -1.4,10.525 h0.35
  text "50" at -1.4,9.9 h0.35
  text "51" at -1.4,9.275 h0.35
  text "52" at -1.4,8.65 h0.35
  text "53" at -1.4,8.025 h0.35
  text "54" at -1.4,7.4 h0.35
  text "55" at -1.4,6.775 h0.35
  text "56" at -1.4,6.15 h0.35
  text "57" at -1.4,5.525 h0.35
  text "58" at -1.4,4.9 h0.35
  text "59" at -1.4,4.275 h0.35
  text "60" at -1.4,3.65 h0.35
  text "61" at -1.4,3.025 h0.35
  text "62" at -1.4,2.4 h0.35
  text "63" at -1.4,1.775 h0.35
  text "64" at -1.4,1.15 h0.35

## Á1825ÂÀ1-2 [mm] "Footprint"
pads (32):
  rect 0.4x0.4 smd mask+0: 1(0,0) 2(0.625,0) 3(1.25,0) 4(1.875,0) 5(2.5,0) 6(3.125,0) 7(3.75,0) 8(4.375,0) 9(5,0) 10(5.625,0) 11(6.25,0) 12(6.875,0) 13(7.5,0) 14(8.125,0) 15(8.75,0) 16(9.375,0) 17(9.375,5) 18(8.75,5) 19(8.125,5) 20(7.5,5) 21(6.875,5) 22(6.25,5) 23(5.625,5) 24(5,5) 25(4.375,5) 26(3.75,5) 27(3.125,5) 28(2.5,5) 29(1.875,5) 30(1.25,5) 31(0.625,5) 32(0,5)
Top Overlay:
  lines w0.05: 2.987,1.3 2.987,0.9 3.387,0.9 ; 5.987,4.1 6.387,4.1 6.387,3.7
Mechanical 1:
  drawing of 164 lines, arcs and shapes, not listed
  text "9" at 4.95,-0.1 h0.35
  text "8" at 4.325,-0.1 h0.35
  text "7" at 3.7,-0.1 h0.35
  text "6" at 3.075,-0.1 h0.35
  text "5" at 2.45,-0.1 h0.35
  text "4" at 1.825,-0.1 h0.35
  text "3" at 1.2,-0.1 h0.35
  text "2" at 0.575,-0.1 h0.35
  text "1" at -0.05,-0.1 h0.35
  text "10" at 5.475,-0.1 h0.35
  text "11" at 6.1,-0.1 h0.35
  text "12" at 6.725,-0.1 h0.35
  text "13" at 7.35,-0.1 h0.35
  text "14" at 7.975,-0.1 h0.35
  text "15" at 8.6,-0.1 h0.35
  text "16" at 9.225,-0.1 h0.35
  text "17" at 9.225,4.9 h0.35
  text "18" at 8.6,4.9 h0.35
  text "19" at 7.975,4.9 h0.35
  text "20" at 7.35,4.9 h0.35
  text "21" at 6.725,4.9 h0.35
  text "22" at 6.1,4.9 h0.35
  text "23" at 5.475,4.9 h0.35
  text "24" at 4.85,4.9 h0.35
  text "25" at 4.225,4.9 h0.35
  text "26" at 3.6,4.9 h0.35
  text "27" at 2.975,4.9 h0.35
  text "28" at 2.35,4.9 h0.35
  text "29" at 1.725,4.9 h0.35
  text "30" at 1.1,4.9 h0.35
  text "31" at 0.475,4.9 h0.35
  text "32" at -0.15,4.9 h0.35
  text ".Comment" at 3.95,1.85 h0.4
  text ".Designator" at 4.3,2.65 h0.6

## Á1825ÂÀ3-2 [mm]
pads (24):
  rect 0.4x0.4 smd mask+0: 1(0,0) 2(0.625,0) 3(1.25,0) 4(1.875,0) 5(2.5,0) 6(3.125,0) 7(3.75,0) 8(4.375,0) 9(5,0) 10(5.625,0) 11(6.25,0) 12(6.875,0) 13(6.875,4.375) 14(6.25,4.375) 15(5.625,4.375) 16(5,4.375) 17(4.375,4.375) 18(3.75,4.375) 19(3.125,4.375) 20(2.5,4.375) 21(1.875,4.375) 22(1.25,4.375) 23(0.625,4.375) 24(0,4.375)
Top Overlay:
  lines w0.05: 0.987,1.287 0.987,0.887 1.387,0.887 ; 5.487,3.487 5.887,3.487 5.887,3.087
Mechanical 1:
  lines w0.05: 0,0.2 0,0.625 ; 0,3.75 0,4.17 ; 0.625,0.2 0.625,0.625 ; 0.625,3.75 0.625,4.17 ; 1.25,0.2 1.25,0.625 ; 1.25,3.75 1.25,4.17 ; 1.875,0.2 1.875,0.625 ; 1.875,3.75 1.875,4.17 ; 2.5,0.2 2.5,0.625 ; 2.5,3.75 2.5,4.17 ; 3.125,0.2 3.125,0.625 ; 3.125,3.75 3.125,4.17 ; 3.75,0.2 3.75,0.625 ; 3.75,3.75 3.75,4.17 ; 4.375,0.2 4.375,0.625 ; 4.375,3.75 4.375,4.17 ; 5,0.2 5,0.625 ; 5,3.75 5,4.17 ; 5.625,0.2 5.625,0.625 ; 5.625,3.75 5.625,4.17 ; 6.25,0.2 6.25,0.625 ; 6.25,3.75 6.25,4.17 ; 6.875,0.2 6.875,0.625 ; 6.875,3.75 6.875,4.17 ; -0.2,-0.2 -0.2,0.2 0.2,0.2 0.2,-0.2 -0.2,-0.2 ; -0.2,4.175 0.2,4.175 0.2,4.575 -0.2,4.575 -0.2,4.175 ; -0.125,0.625 7,0.625 7,3.75 -0.125,3.75 -0.125,0.625 ; 0.425,-0.2 0.425,0.2 0.825,0.2 0.825,-0.2 0.425,-0.2 ; 0.425,4.175 0.425,4.575 0.825,4.575 0.825,4.175 0.425,4.175 ; 1.05,-0.2 1.05,0.2 1.45,0.2 1.45,-0.2 1.05,-0.2 ; 1.05,4.175 1.05,4.575 1.45,4.575 1.45,4.175 1.05,4.175 ; 1.675,-0.2 1.675,0.2 2.075,0.2 2.075,-0.2 1.675,-0.2 ; 1.675,4.175 1.675,4.575 2.075,4.575 2.075,4.175 1.675,4.175 ; 2.3,-0.2 2.3,0.2 2.7,0.2 2.7,-0.2 2.3,-0.2 ; 2.3,4.175 2.3,4.575 2.7,4.575 2.7,4.175 2.3,4.175 ; 2.925,-0.2 2.925,0.2 3.325,0.2 3.325,-0.2 2.925,-0.2 ; 2.925,4.175 2.925,4.575 3.325,4.575 3.325,4.175 2.925,4.175 ; 3.55,-0.2 3.55,0.2 3.95,0.2 3.95,-0.2 3.55,-0.2 ; 3.55,4.175 3.55,4.575 3.95,4.575 3.95,4.175 3.55,4.175 ; 4.175,-0.2 4.175,0.2 4.575,0.2 4.575,-0.2 4.175,-0.2 ; 4.175,4.175 4.175,4.575 4.575,4.575 4.575,4.175 4.175,4.175 ; 4.8,-0.2 4.8,0.2 5.2,0.2 5.2,-0.2 4.8,-0.2 ; 4.8,4.175 4.8,4.575 5.2,4.575 5.2,4.175 4.8,4.175 ; 5.425,-0.2 5.425,0.2 5.825,0.2 5.825,-0.2 5.425,-0.2 ; 5.425,4.175 5.425,4.575 5.825,4.575 5.825,4.175 5.425,4.175 ; 6.05,-0.2 6.05,0.2 6.45,0.2 6.45,-0.2 6.05,-0.2 ; 6.05,4.175 6.05,4.575 6.45,4.575 6.45,4.175 6.05,4.175 ; 6.675,-0.2 6.675,0.2 7.075,0.2 7.075,-0.2 6.675,-0.2 ; 6.675,4.175 6.675,4.575 7.075,4.575 7.075,4.175 6.675,4.175
  text "9" at 4.95,-0.1 h0.35
  text "8" at 4.325,-0.1 h0.35
  text "7" at 3.7,-0.1 h0.35
  text "6" at 3.075,-0.1 h0.35
  text "5" at 2.45,-0.1 h0.35
  text "4" at 1.825,-0.1 h0.35
  text "3" at 1.2,-0.1 h0.35
  text "2" at 0.575,-0.1 h0.35
  text "1" at -0.05,-0.1 h0.35
  text "10" at 5.475,-0.1 h0.35
  text "11" at 6.1,-0.1 h0.35
  text "12" at 6.725,-0.1 h0.35
  text "13" at 6.75,4.275 h0.35
  text "14" at 6.125,4.275 h0.35
  text "15" at 5.5,4.275 h0.35
  text "16" at 4.875,4.275 h0.35
  text "17" at 4.225,4.275 h0.35
  text "18" at 3.6,4.275 h0.35
  text "19" at 2.975,4.275 h0.35
  text "20" at 2.35,4.275 h0.35
  text "21" at 1.725,4.275 h0.35
  text "22" at 1.1,4.275 h0.35
  text "23" at 0.475,4.275 h0.35
  text "24" at -0.15,4.275 h0.35
  text ".Comment" at 2.6,1.6 h0.4
  text ".Designator" at 2.95,2.4 h0.6

## Á1825ÂÊ1-2 [mm] "Footprint"
pads (30):
  rect 0.4x0.4 smd mask+0: 1(0,0) 2(0.625,0) 3(1.25,0) 4(1.875,0) 5(2.5,0) 6(3.125,0) 7(3.75,0) 8(4.375,0) 9(5,0) 10(5.625,0) 11(6.25,0) 12(6.875,0) 13(7.5,0) 14(8.125,0) 15(8.75,0) 16(8.75,5) 17(8.125,5) 18(7.5,5) 19(6.875,5) 20(6.25,5) 21(5.625,5) 22(5,5) 23(4.375,5) 24(3.75,5) 25(3.125,5) 26(2.5,5) 27(1.875,5) 28(1.25,5) 29(0.625,5) 30(0,5)
Top Overlay:
  lines w0.05: 2.725,1.25 2.725,0.85 3.125,0.85 ; 5.625,4.15 6.025,4.15 6.025,3.75
Mechanical 1:
  drawing of 154 lines, arcs and shapes, not listed
  text "9" at 4.95,-0.1 h0.35
  text "8" at 4.325,-0.1 h0.35
  text "7" at 3.7,-0.1 h0.35
  text "6" at 3.075,-0.1 h0.35
  text "5" at 2.45,-0.1 h0.35
  text "4" at 1.825,-0.1 h0.35
  text "3" at 1.2,-0.1 h0.35
  text "2" at 0.575,-0.1 h0.35
  text "1" at -0.05,-0.1 h0.35
  text "10" at 5.475,-0.1 h0.35
  text "11" at 6.1,-0.1 h0.35
  text "12" at 6.725,-0.1 h0.35
  text "13" at 7.35,-0.1 h0.35
  text "14" at 7.975,-0.1 h0.35
  text "15" at 8.6,-0.1 h0.35
  text "17" at 7.975,4.9 h0.35
  text "18" at 7.35,4.9 h0.35
  text "19" at 6.725,4.9 h0.35
  text "20" at 6.1,4.9 h0.35
  text "21" at 5.475,4.9 h0.35
  text "22" at 4.85,4.9 h0.35
  text "23" at 4.225,4.9 h0.35
  text "24" at 3.6,4.9 h0.35
  text "25" at 2.975,4.9 h0.35
  text "26" at 2.35,4.9 h0.35
  text "27" at 1.725,4.9 h0.35
  text "28" at 1.1,4.9 h0.35
  text "29" at 0.475,4.9 h0.35
  text "30" at -0.15,4.9 h0.35
  text ".Comment" at 3.7,1.85 h0.4
  text ".Designator" at 4.05,2.65 h0.6
  text "16" at 8.6,4.9 h0.35

## Í02.8-1Â [mm]
height 6.5
pads (10):
  rect 0.6x2 smd: 1(0,0) 2(1,0) 3(2,0) 4(3,0) 5(4,0) 6(4,14.5) 7(3,14.5) 8(2,14.5) 9(1,14.5) 10(0,14.5)
Top Overlay:
  lines w0.3: -1.25,4 5.25,4 5.25,10.5 -1.25,10.5 -1.25,8.25 cw(c-1.25,7.375) -1.25,6.5 -1.25,4
Mechanical 1:
  lines w0.1: 0,-0.25 1.25,-0.25 ; 0,14.75 1.25,14.75 ; 1.75,-0.25 2.25,-0.25 ; 1.75,14.75 2.25,14.75 ; 2.75,-0.25 4,-0.25 ; 2.75,14.75 4,14.75
  lines w0.2: 0,-0.25 0,4 ; 0,10.5 0,14.75 ; 4,-0.25 4,4 ; 4,10.5 4,14.75 ; -1.25,4 5.25,4 5.25,10.5 -1.25,10.5 -1.25,4
  text ".Designator" at 1.2,7.8 h1.5
  text ".Comment" at -0.7,5.7 h1.5
  text "8" at -0.2,9.1 h1.5
  text "1" at -0.1,4.5 h1.5
  text "5" at 3.7,9.1 h1.5
  text "4" at 3.6,4.5 h1.5
3D body: height 2.9, standoff 0, extent -1.3,-0.3 5.2,14.7

## Í02.8-2Â [mm]
height 6.5
pads (10):
  rect 0.6x2 smd: 1(0,0) 2(1,0) 3(2,0) 4(3,0) 5(4,0) 6(4,14.5) 7(3,14.5) 8(2,14.5) 9(1,14.5) 10(0,14.5)
Top Overlay:
  lines w0.3: -1.25,4 -1.25,6.5 ccw(c-1.25,7.375) -1.25,8.25 -1.25,10.5 5.25,10.5 5.25,4 -1.25,4
Mechanical 1:
  lines w0.1: 0,-0.25 1.25,-0.25 ; 0,14.75 1.25,14.75 ; 1.75,-0.25 2.25,-0.25 ; 1.75,14.75 2.25,14.75 ; 2.75,-0.25 4,-0.25 ; 2.75,14.75 4,14.75
  lines w0.2: 0,-0.25 0,4 ; 0,10.5 0,14.75 ; 4,-0.25 4,4 ; 4,10.5 4,14.75 ; -1.25,4 -1.25,10.5 5.25,10.5 5.25,4 -1.25,4
  text ".Designator" at 1,7.8 h1.5
  text ".Comment" at -0.9,5.7 h1.5
  text "4" at 3.6,4.5 h1.5
  text "5" at 3.7,9.1 h1.5
  text "1" at -0.1,4.5 h1.5
  text "8" at -0.2,9.1 h1.5
3D body: height 2.9, standoff 0, extent -1.3,-0.3 5.2,14.7

## Í04.16-1Â [mm]
height 3
pads (16):
  rect 2.1x0.6 smd: 1(-8.5,-0.5) 8(8.5,-0.5) 9(8.5,0.5) 16(-8.5,0.5)
  rect 0.6x2.1 smd: 2(-2.5,-7.5) 3(-1.5,-7.5) 4(-0.5,-7.5) 5(0.5,-7.5) 6(1.5,-7.5) 7(2.5,-7.5) 10(2.5,7.5) 11(1.5,7.5) 12(0.5,7.5) 13(-0.5,7.5) 14(-1.5,7.5) 15(-2.5,7.5)
Top Overlay:
  lines w0.3: -4.6,-3.8 4.6,-3.8 4.6,3.8 -4.6,3.8 -4.6,-3.8
Mechanical 1:
  lines w0.1: -9,-0.5 -9,0.5 ; -8,0.475 -8,0.5 ; -2.5,-7.84 -0.5,-7.84 ; -2.5,7.84 -0.5,7.84 ; -0.1,-7.84 0.1,-7.84 ; -0.1,7.84 0.1,7.84 ; 0.5,-7.84 2.5,-7.84 ; 0.5,7.84 2.5,7.84 ; 9,-0.5 9,0.5
  lines w0.2: -9,-0.5 -4.6,-0.5 ; -9,0.5 -4.6,0.5 ; -2.5,-7.84 -2.5,-3.8 ; -2.5,3.8 -2.5,7.84 ; 2.5,-7.84 2.5,-3.8 ; 2.5,3.8 2.5,7.84 ; 4.6,-0.5 9,-0.5 ; 4.6,0.5 9,0.5 ; -4.6,-3.8 4.6,-3.8 4.6,3.8 -4.6,3.8 -4.6,-3.8
  text ".Designator" at -0.9,1.1 h1.5
  text ".Comment" at -2.8,-1 h1.5
  text "1" at -3.868,-1.107 h1.5
  text "16" at -3.974,0.293 h1.5
  text "15" at -3.224,2.193 h1.5
  text "2" at -2.828,-3.307 h1.5
  text "8" at 3.022,-1.307 h1.5
  text "10" at 1.776,2.193 h1.5
  text "9" at 3.022,0.543 h1.5
  text "7" at 2.172,-3.307 h1.5

## Í06.24-1Â [mm]
height 3
pads (24):
  rect 2.1x0.6 smd: 1(-8,-0.5) 2(-8,-1.5) 11(8,-1.5) 12(8,-0.5) 13(8,0.5) 14(8,1.5) 23(-8,1.5) 24(-8,0.5)
  rect 0.6x2.1 smd: 3(-3.5,-7.5) 4(-2.5,-7.5) 5(-1.5,-7.5) 6(-0.5,-7.5) 7(0.5,-7.5) 8(1.5,-7.5) 9(2.5,-7.5) 10(3.5,-7.5) 15(3.5,7.5) 16(2.5,7.5) 17(1.5,7.5) 18(0.5,7.5) 19(-0.5,7.5) 20(-1.5,7.5) 21(-2.5,7.5) 22(-3.5,7.5)
Top Overlay:
  lines w0.3: -4.6,-3.8 -4.6,3.8 4.6,3.8 4.6,-3.8 -4.6,-3.8
Mechanical 1:
  lines w0.1: -8.74,-1.5 -8.74,-0.49 ; -8.74,-0.09 -8.74,0.11 ; -8.74,0.51 -8.74,1.5 ; -3.5,-7.94 -0.5,-7.94 ; -3.5,7.94 -0.5,7.94 ; -0.1,-7.94 0.1,-7.94 ; -0.1,7.94 0.1,7.94 ; 0.5,-7.94 3.5,-7.94 ; 0.5,7.94 3.5,7.94 ; 8.74,-1.5 8.74,-0.5 ; 8.74,-0.1 8.74,0.1 ; 8.74,0.5 8.74,1.5
  lines w0.2: -8.74,-1.5 -4.6,-1.5 ; -8.74,1.5 -4.6,1.5 ; -3.5,-7.94 -3.5,-3.8 ; -3.5,3.8 -3.5,7.94 ; 3.5,-7.94 3.5,-3.8 ; 3.5,3.8 3.5,7.94 ; 4.6,-1.5 8.74,-1.5 ; 4.6,1.5 8.74,1.5 ; -4.6,-3.8 -4.6,3.8 4.6,3.8 4.6,-3.8 -4.6,-3.8
  text ".Comment" at -3.1,-1.4 h1.5
  text ".Designator" at -1.2,0.7 h1.5
  text "3" at -3.613,-3.038 h1.5
  text "1" at -3.633,-0.918 h1.5
  text "11" at 2.861,-1.118 h1.5
  text "10" at 2.861,-3.038 h1.5
  text "22" at -3.739,2.382 h1.5
  text "24" at -3.739,0.482 h1.5
  text "14" at 2.861,0.732 h1.5
  text "15" at 2.861,2.382 h1.5